# Altium footprint library IC.PcbLib: 386 footprints (part 28 of 30)
Each footprint in its own frame and in the unit in brackets; x right, y up, seen from the top. Pads: shape width x height; smd on the part's side, far side on the other; paste and mask are expansions set on the pad; w line width, h text height; cw(c..) or ccw(c..) is an arc to the next point about the centre after c.
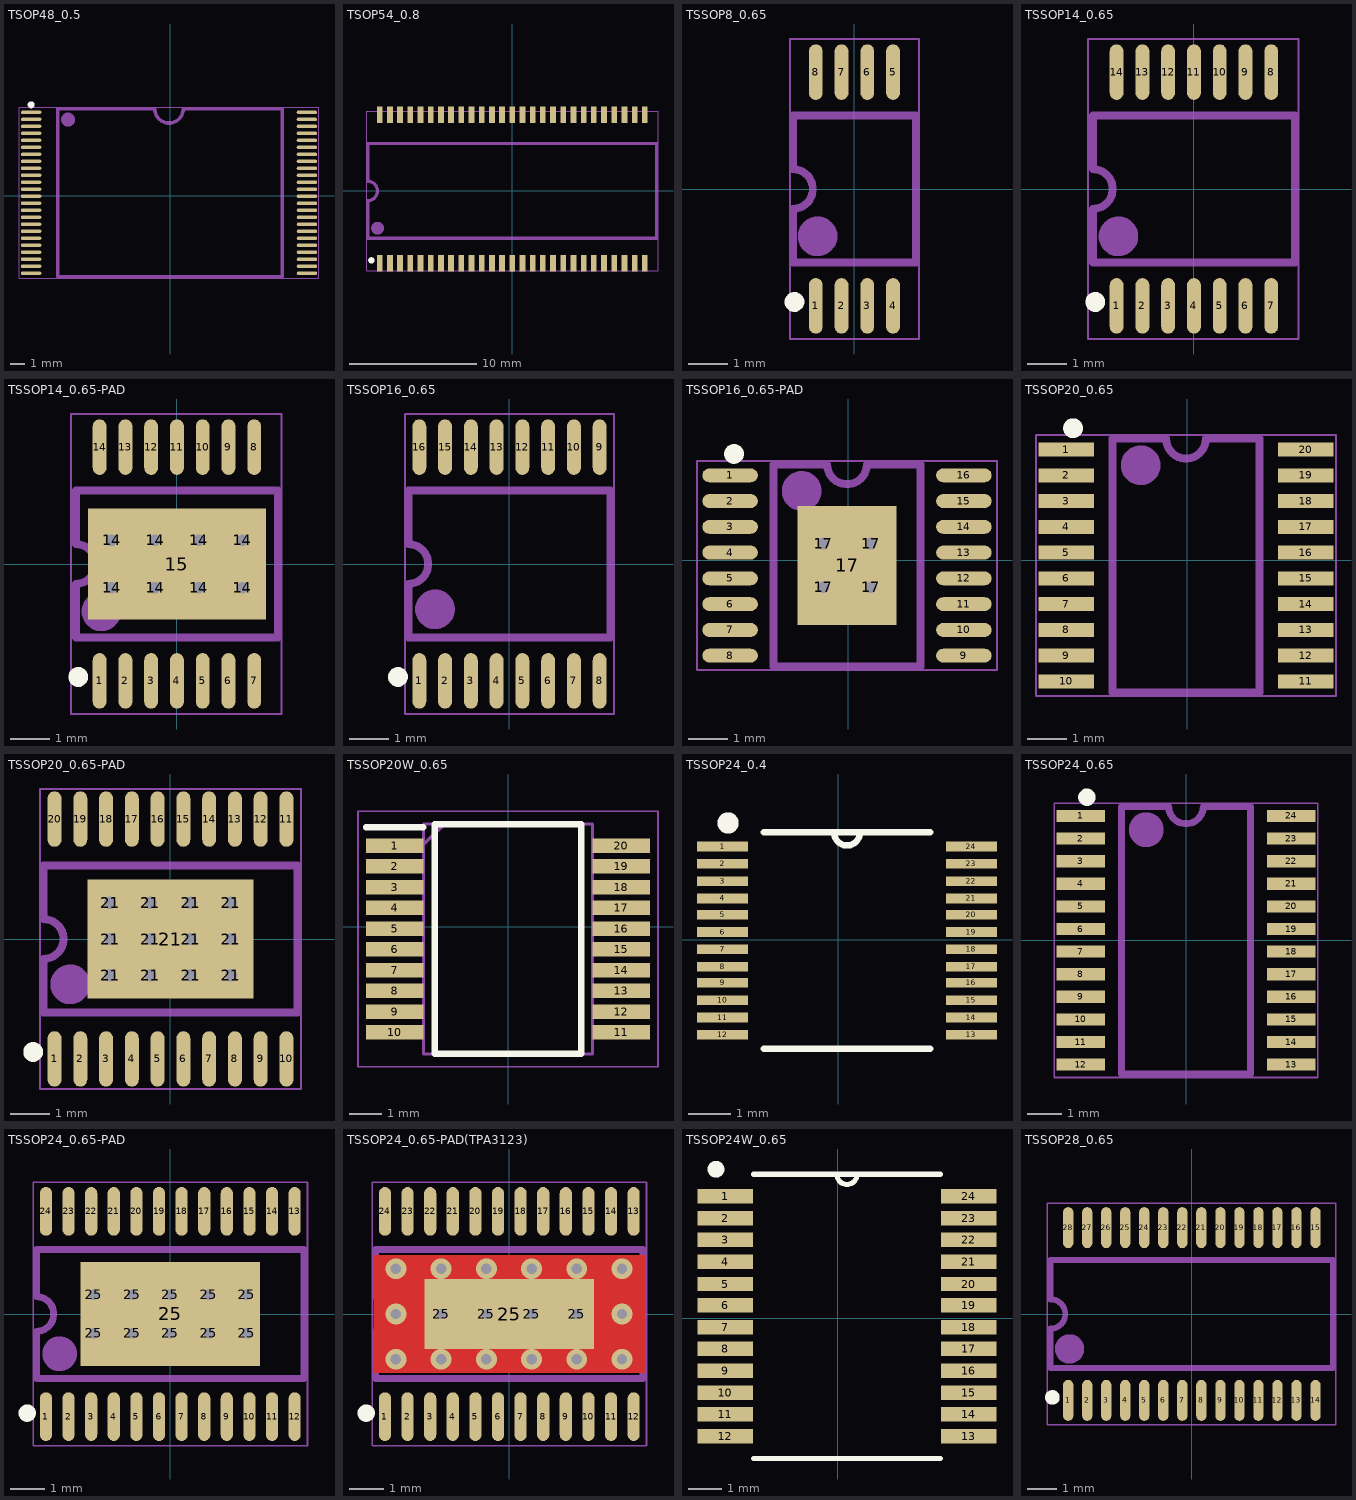
[diagram p27: the footprints below, top view; thin cyan lines are the x and y axes]

## TSOP48_0.5 [mm]
height 0.254
pads (48):
  oval 1.45x0.269 smd: 1(-9.926,5.979) 2(-9.926,5.479) 3(-9.926,4.979) 4(-9.926,4.479) 5(-9.926,3.979) 6(-9.926,3.479) 7(-9.926,2.979) 8(-9.926,2.479) 9(-9.926,1.979) 10(-9.926,1.479) 11(-9.926,0.979) 12(-9.926,0.479) 13(-9.926,-0.021) 14(-9.926,-0.521) 15(-9.926,-1.021) 16(-9.926,-1.521) 17(-9.926,-2.021) 18(-9.926,-2.521) 19(-9.926,-3.021) 20(-9.926,-3.521) 21(-9.926,-4.021) 22(-9.926,-4.521) 23(-9.926,-5.021) 24(-9.926,-5.521) 25(9.774,-5.521) 26(9.774,-5.021) 27(9.774,-4.521) 28(9.774,-4.021) 29(9.774,-3.521) 30(9.774,-3.021) 31(9.774,-2.521) 32(9.774,-2.021) 33(9.774,-1.521) 34(9.774,-1.021) 35(9.774,-0.521) 36(9.774,-0.021) 37(9.774,0.479) 38(9.774,0.979) 39(9.774,1.479) 40(9.774,1.979) 41(9.774,2.479) 42(9.774,2.979) 43(9.774,3.479) 44(9.774,3.979) 45(9.774,4.479) 46(9.774,4.979) 47(9.774,5.479) 48(9.774,5.979)
Top Overlay:
  circle w0.25: c-9.926,6.518 r0.125
Mechanical 15:
  circle w0.6: c-7.29,5.461 r0.2
  lines w0.076: -10.795,-5.867 10.643,-5.867 10.643,6.325 -10.795,6.325 -10.795,-5.867
  lines w0.254: -8.041,-5.771 8.016,-5.771 8.016,6.229 0.94,6.229 cw(c-0.076,6.229) -1.092,6.229 -8.041,6.229 -8.041,-5.771
3D body "TSOP48.STEP": height 1.21, standoff -0.05, extent -10.126,-5.812 9.974,6.288

## TSOP54_0.8 [mm]
height 0.254
pads (54):
  rect 0.45x1.3 smd: 1(-10.4,-5.679) 2(-9.6,-5.679) 3(-8.8,-5.679) 4(-8,-5.679) 5(-7.2,-5.679) 6(-6.4,-5.679) 7(-5.6,-5.679) 8(-4.8,-5.679) 9(-4,-5.679) 10(-3.2,-5.679) 11(-2.4,-5.679) 12(-1.6,-5.679) 13(-0.8,-5.679) 14(0,-5.679) 15(0.8,-5.679) 16(1.6,-5.679) 17(2.4,-5.679) 18(3.2,-5.679) 19(4,-5.679) 20(4.8,-5.679) 21(5.6,-5.679) 22(6.4,-5.679) 23(7.2,-5.679) 24(8,-5.679) 25(8.8,-5.679) 26(9.6,-5.679) 27(10.4,-5.679) 28(10.4,5.983) 29(9.6,5.983) 30(8.8,5.983) 31(8,5.983) 32(7.2,5.983) 33(6.4,5.983) 34(5.6,5.983) 35(4.8,5.983) 36(4,5.983) 37(3.2,5.983) 38(2.4,5.983) 39(1.6,5.983) 40(0.8,5.983) 41(0,5.983) 42(-0.8,5.983) 43(-1.6,5.983) 44(-2.4,5.983) 45(-3.2,5.983) 46(-4,5.983) 47(-4.8,5.983) 48(-5.6,5.983) 49(-6.4,5.983) 50(-7.2,5.983) 51(-8,5.983) 52(-8.8,5.983) 53(-9.6,5.983) 54(-10.4,5.983)
Top Overlay:
  circle w0.25: c-11.049,-5.45 r0.125
Mechanical 15:
  circle w0.6: c-10.566,-2.921 r0.2
  lines w0.076: -11.43,-6.248 -11.43,6.248 11.43,6.248 11.43,-6.248 -11.43,-6.248
  lines w0.254: -11.34,-3.715 11.34,-3.715 11.34,3.715 -11.34,3.715 -11.34,0.762 cw(c-11.34,0) -11.34,-0.762 -11.34,-3.715
3D body "TSOP2-54.STEP": height 1.3, standoff -0.4, extent -11.11,-5.724 11.11,6.036

## TSSOP8_0.65 [mm]
height 0.254
pads (8):
  oval 0.35x1.4 smd: 1(-0.975,-2.95) 2(-0.325,-2.95) 3(0.325,-2.95) 4(0.975,-2.95) 5(0.975,2.95) 6(0.325,2.95) 7(-0.325,2.95) 8(-0.975,2.95)
Top Overlay:
  circle w0.25: c-1.514,-2.85 r0.125
Mechanical 15:
  circle w0.6: c-0.93,-1.194 r0.2
  lines w0.05: -1.626,-3.785 1.626,-3.785 1.626,3.785 -1.626,3.785 -1.626,-3.785
  lines w0.2: -1.55,-1.85 1.55,-1.85 1.55,1.85 -1.55,1.85 -1.55,0.5 cw(c-1.55,0) -1.55,-0.5 -1.55,-1.85
3D body "TSS0P8.STEP": height 1.09, standoff 0, extent -1.425,-3.038 1.575,3.242

## TSSOP14_0.65 [mm] "TSOP, 14-Leads, Body 5.00x4.40mm, Pitch 0.65mm, Thermal Pad 2.31x2.46mm, IPC Low Density"
height 1.2
pads (14):
  oval 0.35x1.4 smd: 1(-1.95,-2.95) 2(-1.3,-2.95) 3(-0.65,-2.95) 4(0,-2.95) 5(0.65,-2.95) 6(1.3,-2.95) 7(1.95,-2.95) 8(1.95,2.95) 9(1.3,2.95) 10(0.65,2.95) 11(0,2.95) 12(-0.65,2.95) 13(-1.3,2.95) 14(-1.95,2.95)
Top Overlay:
  circle w0.25: c-2.489,-2.85 r0.125
Mechanical 15:
  circle w0.6: c-1.905,-1.194 r0.2
  lines w0.05: -2.667,-3.785 2.642,-3.785 2.642,3.785 -2.667,3.785 -2.667,-3.785
  lines w0.2: -2.55,-1.85 2.55,-1.85 2.55,1.85 -2.55,1.85 -2.55,0.5 cw(c-2.55,0) -2.55,-0.5 -2.55,-1.85
3D body "TSSOP14-1.STEP": height 1.1, standoff 0, extent -2.5,-3.2 2.5,3.2

## TSSOP14_0.65-PAD [mm] "TSOP, 14-Leads, Body 5.00x4.40mm, Pitch 0.65mm, Thermal Pad 2.31x2.46mm, IPC Low Density"
height 1.2
pads (23):
  oval 0.35x1.4 smd: 1(-1.95,-2.95) 2(-1.3,-2.95) 3(-0.65,-2.95) 4(0,-2.95) 5(0.65,-2.95) 6(1.3,-2.95) 7(1.95,-2.95) 8(1.95,2.95) 9(1.3,2.95) 10(0.65,2.95) 11(0,2.95) 12(-0.65,2.95) 13(-1.3,2.95) 14(-1.95,2.95)
  round 0.6 hole 0.3: 14(-1.65,-0.6) 14(-1.65,0.6) 14(-0.55,-0.6) 14(-0.55,0.6) 14(0.55,-0.6) 14(0.55,0.6) 14(1.65,-0.6) 14(1.65,0.6)
  rect 4.5x2.8 smd paste-5: 15(0,0)
Top Overlay:
  circle w0.25: c-2.489,-2.85 r0.125
Top Paste:
  region: 2.1,0.15 2.1,1.27 0.15,1.27 0.15,0.15
  region: 0.15,-0.15 0.15,-1.27 2.1,-1.27 2.1,-0.15
  region: -2.1,-0.15 -2.1,-1.27 -0.15,-1.27 -0.15,-0.15
  region: -0.15,0.15 -0.15,1.27 -2.1,1.27 -2.1,0.15
Mechanical 15:
  circle w0.6: c-1.905,-1.194 r0.2
  lines w0.05: -2.667,-3.785 -2.667,3.785 2.642,3.785 2.642,-3.785 -2.667,-3.785
  lines w0.1: -0.5,0 0.5,0 ; 0,-0.5 0,0.5
  lines w0.2: -2.55,-1.85 -2.55,-0.5 ccw(c-2.55,0) -2.55,0.5 -2.55,1.85 2.55,1.85 2.55,-1.85 -2.55,-1.85
3D body "TSSOP14-1.STEP": height 1.1, standoff 0, extent -2.5,-3.2 2.5,3.2

## TSSOP16_0.65 [mm] "Shrink Small Outline; 16 Leads; Body Width 4.4 mm; Pitch 0.65 mm"
height 1.1
pads (16):
  oval 0.35x1.4 smd: 1(-2.275,-2.95) 2(-1.625,-2.95) 3(-0.975,-2.95) 4(-0.325,-2.95) 5(0.325,-2.95) 6(0.975,-2.95) 7(1.625,-2.95) 8(2.275,-2.95) 9(2.275,2.95) 10(1.625,2.95) 11(0.975,2.95) 12(0.325,2.95) 13(-0.325,2.95) 14(-0.975,2.95) 15(-1.625,2.95) 16(-2.275,2.95)
Top Overlay:
  circle w0.25: c-2.814,-2.85 r0.125
Mechanical 15:
  circle w0.6: c-1.88,-1.143 r0.2
  lines w0.05: -2.642,-3.785 -2.642,3.785 2.642,3.785 2.642,-3.785 -2.642,-3.785
  lines w0.2: -2.55,-1.85 -2.55,-0.5 ccw(c-2.55,0) -2.55,0.5 -2.55,1.85 2.55,1.85 2.55,-1.85 -2.55,-1.85
3D body "TSSOP16.STEP": height 1.09, standoff 0, extent -2.5,-3.14 2.5,3.14
3D body "TSSOP16.STEP": height 1.09, standoff 0, extent -2.5,-3.14 2.5,3.14

## TSSOP16_0.65-PAD [mm] "Shrink Small Outline; 16 Leads; Body Width 4.4 mm; Pitch 0.65 mm"
height 1.1
pads (21):
  oval 1.4x0.35 smd: 1(-2.975,2.148) 2(-2.975,1.498) 3(-2.975,0.848) 4(-2.975,0.198) 5(-2.975,-0.452) 6(-2.975,-1.102) 7(-2.975,-1.752) 8(-2.975,-2.402) 9(2.925,-2.402) 10(2.925,-1.752) 11(2.925,-1.102) 12(2.925,-0.452) 13(2.925,0.198) 14(2.925,0.848) 15(2.925,1.498) 16(2.925,2.148)
  round 0.6 hole 0.3: 17(-0.625,-0.677) 17(-0.625,0.423) 17(0.575,-0.677) 17(0.575,0.423)
  rect 2.5x3 smd paste-3: 17(-0.025,-0.127)
Top Overlay:
  circle w0.25: c-2.875,2.687 r0.125
Top Paste:
  rectangle: 0.125,-1.549 1.143,-0.277
  region: -0.175,-0.277 -1.194,-0.277 -1.194,-1.549 -0.175,-1.549
  region: -0.175,1.295 -1.194,1.295 -1.194,0.023 -0.175,0.023
  rectangle: 0.125,0.023 1.143,1.295
Mechanical 15:
  circle w0.6: c-1.168,1.753 r0.2
  lines w0.05: -3.81,-2.769 -3.81,2.515 3.759,2.515 3.759,-2.769 -3.81,-2.769
  lines w0.2: -1.875,-2.677 -1.875,2.423 -0.525,2.423 ccw(c-0.025,2.423) 0.475,2.423 1.825,2.423 1.825,-2.677 -1.875,-2.677
3D body "TSSOP16.STEP": height 1.09, standoff 0, extent -3.165,-2.627 3.115,2.373
3D body "TSSOP16.STEP": height 1.09, standoff 0, extent -3.165,-2.627 3.115,2.373

## TSSOP20_0.65 [mm] "TSOP, 20-Leads, Body 6.6x4.5mm (max), Pitch 0.65mm, IPC Medium Density"
height 1.2
pads (20):
  rect 1.4x0.35 smd: 1(-3.052,2.798) 2(-3.052,2.148) 3(-3.052,1.498) 4(-3.052,0.848) 5(-3.052,0.198) 6(-3.052,-0.452) 7(-3.052,-1.102) 8(-3.052,-1.752) 9(-3.052,-2.402) 10(-3.052,-3.052) 11(3.001,-3.052) 12(3.001,-2.402) 13(3.001,-1.752) 14(3.001,-1.102) 15(3.001,-0.452) 16(3.001,0.198) 17(3.001,0.848) 18(3.001,1.498) 19(3.001,2.148) 20(3.001,2.798)
Top Overlay:
  circle w0.25: c-2.875,3.337 r0.125
Mechanical 15:
  circle w0.6: c-1.168,2.403 r0.2
  lines w0.05: -3.81,-3.419 -3.81,3.165 3.759,3.165 3.759,-3.419 -3.81,-3.419
  lines w0.2: -1.875,-3.327 -1.875,3.073 -0.525,3.073 ccw(c-0.025,3.073) 0.475,3.073 1.825,3.073 1.825,-3.327 -1.875,-3.327
3D body "TSSOP20-0.65.STEP": height 1.2, standoff 0, extent -3.3,-3.427 3.25,3.173

## TSSOP20_0.65-PAD [mm] "TSOP, 20-Leads, Body 6.6x4.5mm (max), Pitch 0.65mm, IPC Medium Density"
height 1.2
pads (33):
  oval 0.35x1.4 smd: 1(-2.925,-3.026) 2(-2.275,-3.026) 3(-1.625,-3.026) 4(-0.975,-3.026) 5(-0.325,-3.026) 6(0.325,-3.026) 7(0.975,-3.026) 8(1.625,-3.026) 9(2.275,-3.026) 10(2.925,-3.026) 11(2.925,3.026) 12(2.275,3.026) 13(1.625,3.026) 14(0.975,3.026) 15(0.325,3.026) 16(-0.325,3.026) 17(-0.975,3.026) 18(-1.625,3.026) 19(-2.275,3.026) 20(-2.925,3.026)
  round 0.61 hole 0.305: 21(-1.524,-0.914) 21(-1.524,0) 21(-1.524,0.914) 21(-0.508,-0.914) 21(-0.508,0) 21(-0.508,0.914) 21(0.508,-0.914) 21(0.508,0) 21(0.508,0.914) 21(1.524,-0.914) 21(1.524,0) 21(1.524,0.914)
  rect 4.2x3 smd paste-3: 21(0,0)
Top Overlay:
  circle w0.25: c-3.464,-2.85 r0.125
Top Paste:
  region: -0.15,0.15 -0.15,1.372 -1.981,1.372 -1.981,0.15
  region: -1.981,-0.15 -1.981,-1.372 -0.15,-1.372 -0.15,-0.15
  region: 0.15,-0.15 0.15,-1.372 1.981,-1.372 1.981,-0.15
  region: 1.981,0.15 1.981,1.372 0.15,1.372 0.15,0.15
Mechanical 15:
  circle w0.6: c-2.53,-1.143 r0.2
  lines w0.05: -3.292,-3.785 3.292,-3.785 3.292,3.785 -3.292,3.785 -3.292,-3.785
  lines w0.1: -0.5,0 0.5,0 ; 0,-0.5 0,0.5
  lines w0.2: -3.2,-1.85 3.2,-1.85 3.2,1.85 -3.2,1.85 -3.2,0.5 cw(c-3.2,0) -3.2,-0.5 -3.2,-1.85
3D body "TSSOP20-0.65.STEP": height 1.2, standoff 0, extent -3.3,-3.275 3.3,3.275

## TSSOP20W_0.65 [mm]
pads (20):
  rect 1.8x0.45 smd: 1(-3.55,2.544) 2(-3.55,1.894) 3(-3.55,1.244) 4(-3.55,0.594) 5(-3.55,-0.056) 6(-3.55,-0.706) 7(-3.55,-1.356) 8(-3.55,-2.006) 9(-3.55,-2.656) 10(-3.55,-3.306) 11(3.55,-3.306) 12(3.55,-2.656) 13(3.55,-2.006) 14(3.55,-1.356) 15(3.55,-0.706) 16(3.55,-0.056) 17(3.55,0.594) 18(3.55,1.244) 19(3.55,1.894) 20(3.55,2.544)
Top Overlay:
  lines w0.2: -4.45,3.119 -2.65,3.119 ; -2.3,-3.981 -2.3,3.219 2.3,3.219 2.3,-3.981 -2.3,-3.981
Mechanical 13:
  lines w0.1: -2.65,2.569 -2,3.219 ; -2.65,-3.981 -2.65,3.219 2.65,3.219 2.65,-3.981 -2.65,-3.981
Mechanical 15:
  lines w0.05: -4.7,-4.381 -4.7,3.619 4.7,3.619 4.7,-4.381 -4.7,-4.381
3D body "SN74AHC244DBR.stp": height 2, standoff 0, extent -3.9,-3.981 3.9,3.219

## TSSOP24_0.4 [mil]
height 47.24
pads (24):
  rect 47.24x9 smd: 1(-107,86) 2(-107,70) 3(-107,54) 4(-107,38) 5(-107,23) 6(-107,7) 7(-107,-9) 8(-107,-25) 9(-107,-40) 10(-107,-56) 11(-107,-72) 12(-107,-88) 13(123,-88) 14(123,-72) 15(123,-56) 16(123,-40) 17(123,-25) 18(123,-9) 19(123,7) 20(123,23) 21(123,38) 22(123,54) 23(123,70) 24(123,86)
Top Overlay:
  circle w9.84: c-101.98,107.8 r4.92
  lines w6: -69,-101 85,-101 ; -69,99 -4,99 ; 85,99 20,99 ; -4,99 ccw(c8,99) 20,99 ; -4,99 20,99
3D body "TSSOP40P610X95-24N.step": height 37.4, standoff 0, extent -114.07,-99.42 126.08,97.43

## TSSOP24_0.65 [mm] "TSOP, 24-Leads, Body 7.80x4.40mm, Pitch 0.65mm, Thermal Pad 5.16x2.40mm, IPC Low Density"
height 1.2
pads (24):
  rect 1.4x0.35 smd: 1(-3.026,3.575) 2(-3.026,2.925) 3(-3.026,2.275) 4(-3.026,1.625) 5(-3.026,0.975) 6(-3.026,0.325) 7(-3.026,-0.325) 8(-3.026,-0.975) 9(-3.026,-1.625) 10(-3.026,-2.275) 11(-3.026,-2.925) 12(-3.026,-3.575) 13(3.026,-3.575) 14(3.026,-2.925) 15(3.026,-2.275) 16(3.026,-1.625) 17(3.026,-0.975) 18(3.026,-0.325) 19(3.026,0.325) 20(3.026,0.975) 21(3.026,1.625) 22(3.026,2.275) 23(3.026,2.925) 24(3.026,3.575)
Top Overlay:
  circle w0.25: c-2.85,4.114 r0.125
Mechanical 15:
  circle w0.6: c-1.143,3.18 r0.2
  lines w0.05: -3.785,-3.942 3.785,-3.942 3.785,3.942 -3.785,3.942 -3.785,-3.942
  lines w0.2: -1.85,-3.85 1.85,-3.85 1.85,3.85 0.5,3.85 cw(c0,3.85) -0.5,3.85 -1.85,3.85 -1.85,-3.85
3D body "TSSOP24-0.65.STEP": height 1.2, standoff 0, extent -3.278,-3.95 3.278,3.95

## TSSOP24_0.65-PAD [mm] "TSOP, 24-Leads, Body 7.80x4.40mm, Pitch 0.65mm, Thermal Pad 5.16x2.40mm, IPC Low Density"
height 1.2
pads (35):
  oval 0.35x1.4 smd: 1(-3.575,-2.95) 2(-2.925,-2.95) 3(-2.275,-2.95) 4(-1.625,-2.95) 5(-0.975,-2.95) 6(-0.325,-2.95) 7(0.325,-2.95) 8(0.975,-2.95) 9(1.625,-2.95) 10(2.275,-2.95) 11(2.925,-2.95) 12(3.575,-2.95) 13(3.575,2.95) 14(2.925,2.95) 15(2.275,2.95) 16(1.625,2.95) 17(0.975,2.95) 18(0.325,2.95) 19(-0.325,2.95) 20(-0.975,2.95) 21(-1.625,2.95) 22(-2.275,2.95) 23(-2.925,2.95) 24(-3.575,2.95)
  round 0.6 hole 0.3: 25(-2.2,-0.55) 25(-2.2,0.55) 25(-1.1,-0.55) 25(-1.1,0.55) 25(0,-0.55) 25(0,0.55) 25(1.1,-0.55) 25(1.1,0.55) 25(2.2,-0.55) 25(2.2,0.55)
  rect 5.16x3 smd paste-5: 25(0,0)
Top Overlay:
  circle w0.25: c-4.114,-2.85 r0.125
Top Paste:
  region: -0.15,0.15 -0.15,1.118 -1.092,1.118 -1.092,0.15
  region: 1.092,0.15 1.092,1.118 0.15,1.118 0.15,0.15
  region: -1.392,0.15 -1.392,1.118 -2.334,1.118 -2.334,0.15
  region: 2.334,0.15 2.334,1.118 1.392,1.118 1.392,0.15
  region: 1.392,-0.15 1.392,-1.118 2.334,-1.118 2.334,-0.15
  region: -2.334,-0.15 -2.334,-1.118 -1.392,-1.118 -1.392,-0.15
  region: 0.15,-0.15 0.15,-1.118 1.092,-1.118 1.092,-0.15
  region: -1.092,-0.15 -1.092,-1.118 -0.15,-1.118 -0.15,-0.15
Mechanical 15:
  circle w0.6: c-3.18,-1.143 r0.2
  lines w0.05: -3.942,-3.785 3.942,-3.785 3.942,3.785 -3.942,3.785 -3.942,-3.785
  lines w0.1: -0.5,0 0.5,0 ; 0,-0.5 0,0.5
  lines w0.2: -3.85,-1.85 3.85,-1.85 3.85,1.85 -3.85,1.85 -3.85,0.5 cw(c-3.85,0) -3.85,-0.5 -3.85,-1.85
3D body "TSSOP24-0.65.STEP": height 1.2, standoff 0, extent -3.95,-3.278 3.95,3.278

## TSSOP24_0.65-PAD(TPA3123) [mm] "TSOP, 24-Leads, Body 7.80x4.40mm, Pitch 0.65mm, Thermal Pad 5.16x2.40mm, IPC Low Density"
height 1.2
pads (29):
  oval 0.35x1.4 smd: 1(-3.575,-2.95) 2(-2.925,-2.95) 3(-2.275,-2.95) 4(-1.625,-2.95) 5(-0.975,-2.95) 6(-0.325,-2.95) 7(0.325,-2.95) 8(0.975,-2.95) 9(1.625,-2.95) 10(2.275,-2.95) 11(2.925,-2.95) 12(3.575,-2.95) 13(3.575,2.95) 14(2.925,2.95) 15(2.275,2.95) 16(1.625,2.95) 17(0.975,2.95) 18(0.325,2.95) 19(-0.325,2.95) 20(-0.975,2.95) 21(-1.625,2.95) 22(-2.275,2.95) 23(-2.925,2.95) 24(-3.575,2.95)
  round 0.6 hole 0.3: 25(-1.96,0) 25(-0.66,0) 25(0.64,0) 25(1.94,0)
  rect 4.87x2 smd paste-5: 25(0,0)
via -1.96,1.3 diameter 0.6 hole 0.3
via -3.26,1.3 diameter 0.6 hole 0.3
via -0.66,1.3 diameter 0.6 hole 0.3
via 0.64,1.3 diameter 0.6 hole 0.3
via 1.94,1.3 diameter 0.6 hole 0.3
via 3.24,1.3 diameter 0.6 hole 0.3
via 3.24,-1.3 diameter 0.6 hole 0.3
via 1.94,-1.3 diameter 0.6 hole 0.3
via 0.64,-1.3 diameter 0.6 hole 0.3
via -0.66,-1.3 diameter 0.6 hole 0.3
via -3.26,-1.3 diameter 0.6 hole 0.3
via -1.96,-1.3 diameter 0.6 hole 0.3
via 3.24,0 diameter 0.6 hole 0.3
via -3.26,0 diameter 0.6 hole 0.3
Top Layer:
  region: 3.9,-1.7 3.9,1.7 -3.9,1.7 -3.9,-1.7
Top Overlay:
  circle w0.25: c-4.114,-2.85 r0.125
Top Paste:
  region: -1.088,0.993 -1.088,0.127 -0.145,0.127 -0.145,0.993
  region: -0.145,-0.993 -0.145,-0.127 -1.088,-0.127 -1.088,-0.993
  region: 1.088,-0.993 1.088,-0.127 0.145,-0.127 0.145,-0.993
  region: 0.145,0.993 0.145,0.127 1.088,0.127 1.088,0.993
  region: -1.378,-0.993 -1.378,-0.127 -2.321,-0.127 -2.321,-0.993
  region: -2.321,0.993 -2.321,0.127 -1.378,0.127 -1.378,0.993
  region: 1.378,0.993 1.378,0.127 2.321,0.127 2.321,0.993
  region: 2.321,-0.993 2.321,-0.127 1.378,-0.127 1.378,-0.993
Mechanical 15:
  circle w0.6: c-3.18,-1.143 r0.2
  lines w0.05: -3.942,-3.785 3.942,-3.785 3.942,3.785 -3.942,3.785 -3.942,-3.785
  lines w0.1: -0.5,0 0.5,0 ; 0,-0.5 0,0.5
  lines w0.2: -3.85,-1.85 3.85,-1.85 3.85,1.85 -3.85,1.85 -3.85,0.5 cw(c-3.85,0) -3.85,-0.5 -3.85,-1.85
3D body "TSSOP24-0.65.STEP": height 1.2, standoff 0, extent -3.95,-3.278 3.95,3.278

## TSSOP24W_0.65 [mil] "TSOP, 24-Leads, Body 7.80x4.40mm, Pitch 0.65mm, Thermal Pad 5.16x2.40mm, IPC Low Density"
height 47.24
pads (24):
  rect 65x17 smd: 1(-132,143) 2(-132,117) 3(-132,92) 4(-132,66) 5(-132,40) 6(-132,15) 7(-132,-11) 8(-132,-36) 9(-132,-62) 10(-132,-88) 11(-132,-113) 12(-132,-139) 13(154,-139) 14(154,-113) 15(154,-88) 16(154,-62) 17(154,-36) 18(154,-11) 19(154,15) 20(154,40) 21(154,66) 22(154,92) 23(154,117) 24(154,143)
Top Overlay:
  circle w9.84: c-142.98,174.8 r4.92
  lines w6: -99,-165 121,-165 ; -99,169 -1,169 ; 121,169 23,169 ; -1,169 ccw(c11,169) 23,169 ; -1,169 23,169
3D body "SSOP24-0.65.STEP": height 74.73, standoff 0.07, extent -137.61,-160.05 159.61,164.06

## TSSOP28_0.65 [mm]
pads (28):
  oval 0.35x1.4 smd: 1(-4.225,-2.95) 2(-3.575,-2.95) 3(-2.925,-2.95) 4(-2.275,-2.95) 5(-1.625,-2.95) 6(-0.975,-2.95) 7(-0.325,-2.95) 8(0.325,-2.95) 9(0.975,-2.95) 10(1.625,-2.95) 11(2.275,-2.95) 12(2.925,-2.95) 13(3.575,-2.95) 14(4.225,-2.95) 15(4.225,2.95) 16(3.575,2.95) 17(2.925,2.95) 18(2.275,2.95) 19(1.625,2.95) 20(0.975,2.95) 21(0.325,2.95) 22(-0.325,2.95) 23(-0.975,2.95) 24(-1.625,2.95) 25(-2.275,2.95) 26(-2.925,2.95) 27(-3.575,2.95) 28(-4.225,2.95)
Top Overlay:
  circle w0.25: c-4.764,-2.85 r0.125
Mechanical 15:
  circle w0.6: c-4.18,-1.194 r0.2
  lines w0.05: -4.942,-3.785 -4.942,3.785 4.917,3.785 4.917,-3.785 -4.942,-3.785
  lines w0.2: -4.826,1.85 4.825,1.85 4.825,-1.85 -4.825,-1.85 -4.825,-0.5 ccw(c-4.825,0) -4.825,0.5 -4.825,1.85
3D body "TSSOP28-0.65B.STEP": height 1.2, standoff 0, extent -4.9,-3.2 4.9,3.2